# Altium footprint library Conectores.PcbLib: 68 footprints (part 1 of 5)
Each footprint in its own frame and in the unit in brackets; x right, y up, seen from the top. Pads: shape width x height; smd on the part's side, far side on the other; paste and mask are expansions set on the pad; w line width, h text height; cw(c..) or ccw(c..) is an arc to the next point about the centre after c.
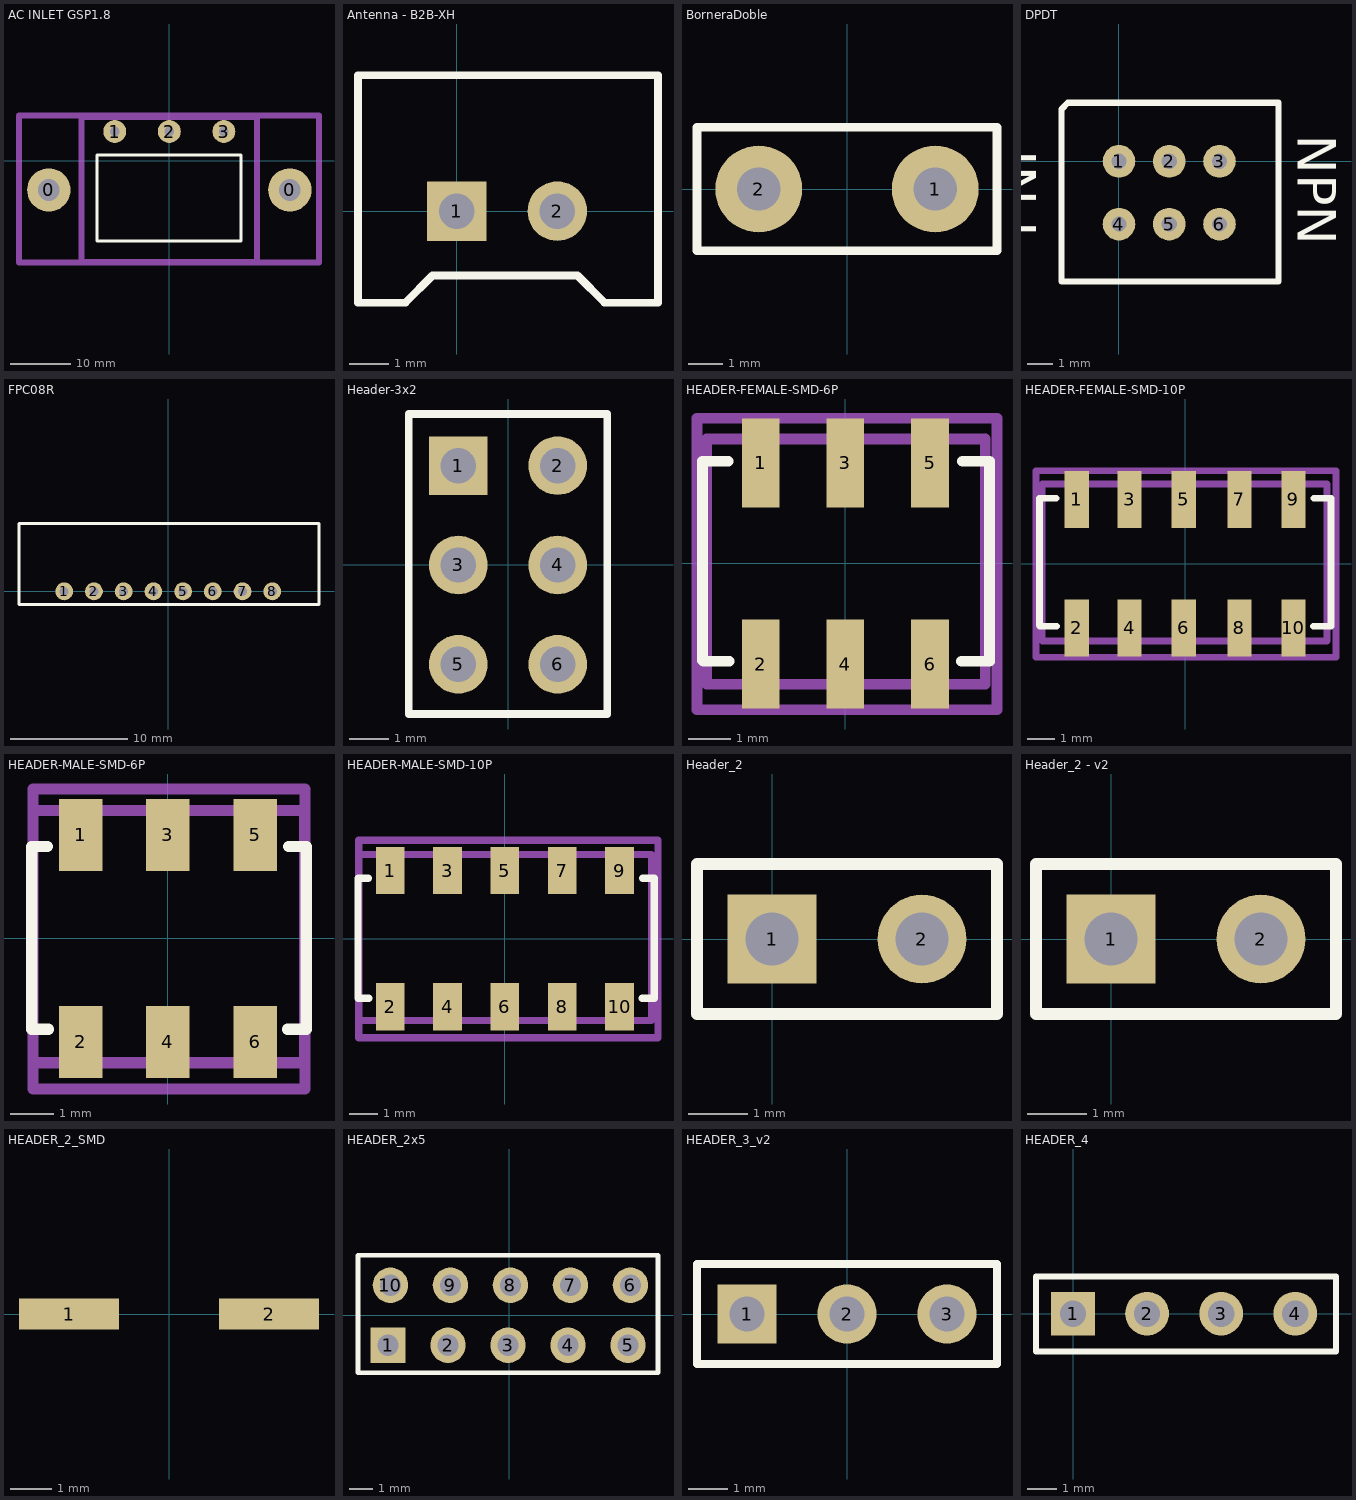
[diagram p0: the footprints below, top view; thin cyan lines are the x and y axes]

## AC INLET GSP1.8 [mm] "AC Power Connector GSP1.8 C14"
pads (5):
  round 7.2 hole 3.6: 0(-20,-4.85) 0(20,-4.85)
  round 3.8 hole 1.6: 1(-9.05,4.85) 2(0,4.85) 3(9.05,4.85)
Top Overlay:
  lines w0.5: -11.963,-13.31 -11.963,0.965 11.913,0.965 11.913,-13.31 -11.963,-13.31
Mechanical 13:
  lines w1: -14.605,-16.764 -14.605,7.264 14.58,7.264 14.58,-16.764 -14.605,-16.764
Mechanical 15:
  lines w1: -24.943,-16.891 -24.943,7.518 24.841,7.518 24.841,-16.891 -24.943,-16.891
3D body: height 30.6, standoff -3.4, extent -24.81,-16.847 24.79,7.452

## Antenna - B2B-XH [mm] "2-pin Header for RDM6300 Antenna"
pads (2):
  rect 1.5x1.5 hole 0.9: 1(0,0)
  round 1.5 hole 0.9: 2(2.54,0)
Top Overlay:
  lines w0.2: -2.489,-2.311 -2.489,3.429 5.08,3.429 5.08,-2.311 3.734,-2.311 3.048,-1.626 -0.61,-1.626 -1.295,-2.311 -2.489,-2.311
3D body: height 7, standoff -3.3, extent -2.48,-2.271 5.02,3.429

## BorneraDoble [mm]
pads (2):
  round 2.5 hole 1.25: 1(2.54,0) 2(-2.54,0)
Top Overlay:
  lines w0.254: -4.318,-1.778 4.318,-1.778 4.318,1.778 -4.318,1.778 -4.318,-1.778
3D body: height 10.75, standoff -3.95, extent -4.92,-3.933 5.08,9.521

## DPDT [mm] "DPDT top actuated PCB switch on-off"
pads (6):
  round 1.3 hole 0.6: 1(0,0) 2(2,0) 3(4,0) 4(0,-2.5) 5(2,-2.5) 6(4,-2.5)
Top Overlay:
  lines w0.254: -2.286,-4.786 6.35,-4.786 6.35,2.326 -2.032,2.326 -2.286,2.072 -2.286,-4.786
  text "NPN" at 7.112,1.056 h1.52
  text "PNP" at -3.302,-3.008 h1.52

## FPC08R [mil] "FFC / FPC 8 ways 2.54mm LIF DIP horizontal"
pads (8):
  round 60 hole 30: 1(-350,0) 2(-250,0) 3(-150,0) 4(-50,0) 5(50,0) 6(150,0) 7(250,0) 8(350,0)
Top Overlay:
  lines w10: -502,-45 -502,229 507,229 507,-45 -502,-45
3D body: height 177.17, standoff -117.63, extent -504.96,-31.89 510,231.89

## Header-3x2 [mm] "HEADER, 2X3, 2.54MM X 2.54MM PITCH, VERT, TH"
pads (6):
  rect 1.5x1.5 hole 0.9: 1(-1.27,2.54)
  round 1.5 hole 0.9: 2(1.27,2.54) 3(-1.27,0) 4(1.27,0) 5(-1.27,-2.54) 6(1.27,-2.54)
Top Overlay:
  lines w0.2: -2.54,-3.81 2.54,-3.81 2.54,3.861 -2.54,3.861 -2.54,-3.81
3D body: height 8.38, standoff -3.81, extent -2.54,-3.81 2.54,3.81

## HEADER-FEMALE-SMD-6P [mm] "6 Position Receptacle, Bottom or Top Entry Connector Gold 2.00mm Surface Mount"
pads (6):
  rect 0.89x2.1 smd: 1(-2,2.375) 2(-2,-2.375) 3(0,2.375) 4(0,-2.375) 5(2,2.375) 6(2,-2.375)
Top Overlay:
  lines w0.254: -2.769,2.413 -3.378,2.413 -3.378,-2.286 -3.353,-2.311 -2.743,-2.311 ; 2.743,-2.311 3.404,-2.311 ; 2.769,2.413 3.404,2.413 ; 3.404,-2.286 3.404,2.388
Mechanical 13:
  lines w0.254: -3.277,-2.853 3.302,-2.853 3.302,2.938 -3.277,2.938 -3.277,-2.853
Mechanical 15:
  lines w0.254: -3.505,-3.454 3.581,-3.454 3.581,3.429 -3.505,3.429 -3.505,-3.454
3D body: height 4.3, standoff 0.01, extent -3.224,-3.062 3.276,3.164

## HEADER-FEMALE-SMD-10P [mm] "10 Position Connector Plug, Outer Shroud Contacts Surface Mount Gold"
pads (10):
  rect 0.89x2.1 smd: 1(-4,2.375) 2(-4,-2.375) 3(-2.051,2.375) 4(-2.051,-2.375) 5(-0.051,2.375) 6(-0.051,-2.375) 7(2,2.375) 8(2,-2.375) 9(4,2.375) 10(4,-2.375)
Top Overlay:
  lines w0.254: -4.769,2.413 -5.378,2.413 -5.378,-2.286 -5.353,-2.311 -4.743,-2.311 ; 4.731,-2.311 5.391,-2.311 ; 4.756,2.413 5.391,2.413 ; 5.391,-2.286 5.391,2.388
Mechanical 13:
  lines w0.254: -5.277,-2.853 5.239,-2.853 5.239,2.938 -5.277,2.938 -5.277,-2.853
Mechanical 15:
  lines w0.254: -5.505,-3.454 5.569,-3.454 5.569,3.429 -5.505,3.429 -5.505,-3.454
3D body: height 4.3, standoff -0.04, extent -5.351,-3.036 5.149,3.189

## HEADER-MALE-SMD-6P [mm] "6 Positions Header, Cuttable Connector 2.00mm Surface Mount Gold"
pads (6):
  rect 1x1.65 smd: 1(-2,2.375) 2(-2,-2.375) 3(0,2.375) 4(0,-2.375) 5(2,2.375) 6(2,-2.375)
Top Overlay:
  lines w0.254: -2.769,2.108 -3.124,2.108 -3.124,-2.083 -2.743,-2.083 ; 2.743,-2.083 3.175,-2.083 3.175,2.108 2.769,2.108
Mechanical 13:
  lines w0.254: -3.099,-2.853 3.132,-2.853 3.132,2.938 -3.099,2.938 -3.099,-2.853
Mechanical 15:
  lines w0.254: -3.099,-3.454 3.15,-3.454 3.15,3.429 -3.099,3.429 -3.099,-3.454
3D body: height 6, standoff 0, extent -3,-2.812 3,2.938

## HEADER-MALE-SMD-10P [mm] "10 Positions Header, Cuttable Connector 0.079\" (2.00mm) Surface Mount Gold"
pads (10):
  rect 1x1.65 smd: 1(-4,2.375) 2(-4,-2.375) 3(-2,2.375) 4(-2,-2.375) 5(0,2.375) 6(0,-2.375) 7(2,2.375) 8(2,-2.375) 9(4,2.375) 10(4,-2.375)
Top Overlay:
  lines w0.254: -4.769,2.108 -5.124,2.108 -5.124,-2.083 -4.743,-2.083 ; 4.782,-2.083 5.214,-2.083 5.214,2.108 4.807,2.108
Mechanical 13:
  lines w0.254: -5.099,-2.853 -5.099,2.938 5.112,2.938 5.112,-2.853 -5.099,-2.853
Mechanical 15:
  lines w0.254: -5.099,-3.454 -5.099,3.429 5.341,3.429 5.341,-3.454 -5.099,-3.454
3D body: height 6, standoff 0, extent -4.978,-2.723 5.022,3.027

## Header_2 [mm] "2-pin Male Header"
pads (2):
  rect 1.5x1.5 hole 0.9: 1(0,0)
  round 1.5 hole 0.9: 2(2.54,0)
Top Overlay:
  lines w0.2: -1.27,-1.27 -1.27,1.27 3.81,1.27 3.81,-1.27 -1.27,-1.27
3D body: height 9.5, standoff -2.6, extent -1.154,-1.245 3.846,1.295

## Header_2 - v2 [mm] "2-pin Male Header - No shunt"
pads (2):
  rect 1.5x1.5 hole 0.9: 1(0,0)
  round 1.5 hole 0.9: 2(2.54,0)
Top Overlay:
  lines w0.2: -1.27,-1.27 -1.27,1.27 3.81,1.27 3.81,-1.27 -1.27,-1.27
3D body: height 8.54, standoff -3, extent -1.27,-1.245 3.81,1.245

## HEADER_2_SMD [mm] "Archer Connectors – M50 - CONN HDR 1.27MM SMD"
pads (2):
  rect 2.4x0.74 smd: 1(-2.4,0) 2(2.4,0)
3D body: height 4.5, standoff 0, extent -2.762,-0.635 2.738,0.635

## HEADER_2x5 [mm] "10-pin male header"
pads (10):
  rect 1.5x1.5 hole 0.9: 1(-5.131,-1.27)
  round 1.5 hole 0.9: 2(-2.591,-1.27) 3(-0.051,-1.27) 4(2.489,-1.27) 5(5.029,-1.27) 6(5.131,1.27) 7(2.591,1.27) 8(0.051,1.27) 9(-2.489,1.27) 10(-5.029,1.27)
Top Overlay:
  lines w0.2: -6.401,-2.438 -6.401,2.54 6.299,2.54 6.299,-2.438 -6.401,-2.438
3D body: height 8.54, standoff -3, extent -6.375,-2.566 6.325,2.464

## HEADER_3_v2 [mm] "3-pin Male Header"
pads (3):
  rect 1.5x1.5 hole 0.9: 1(-2.54,0)
  round 1.5 hole 0.9: 2(0,0) 3(2.54,0)
Top Overlay:
  lines w0.2: -3.81,-1.27 3.81,-1.27 3.81,1.27 -3.81,1.27 -3.81,-1.27
3D body: height 8.54, standoff -3, extent -3.81,-1.245 3.81,1.245

## HEADER_4 [mm] "4-pin male header"
pads (4):
  rect 1.5x1.5 hole 0.9: 1(0,0)
  round 1.5 hole 0.9: 2(2.54,0) 3(5.08,0) 4(7.62,0)
Top Overlay:
  lines w0.2: -1.27,-1.295 -1.27,1.27 9.017,1.27 9.017,-1.295 -1.27,-1.295
3D body: height 8.54, standoff -3, extent -1.27,-1.245 8.89,1.245